# Altium schematic symbol library AA_Symbols.SchLib: 1017 symbols (part 4 of 7)
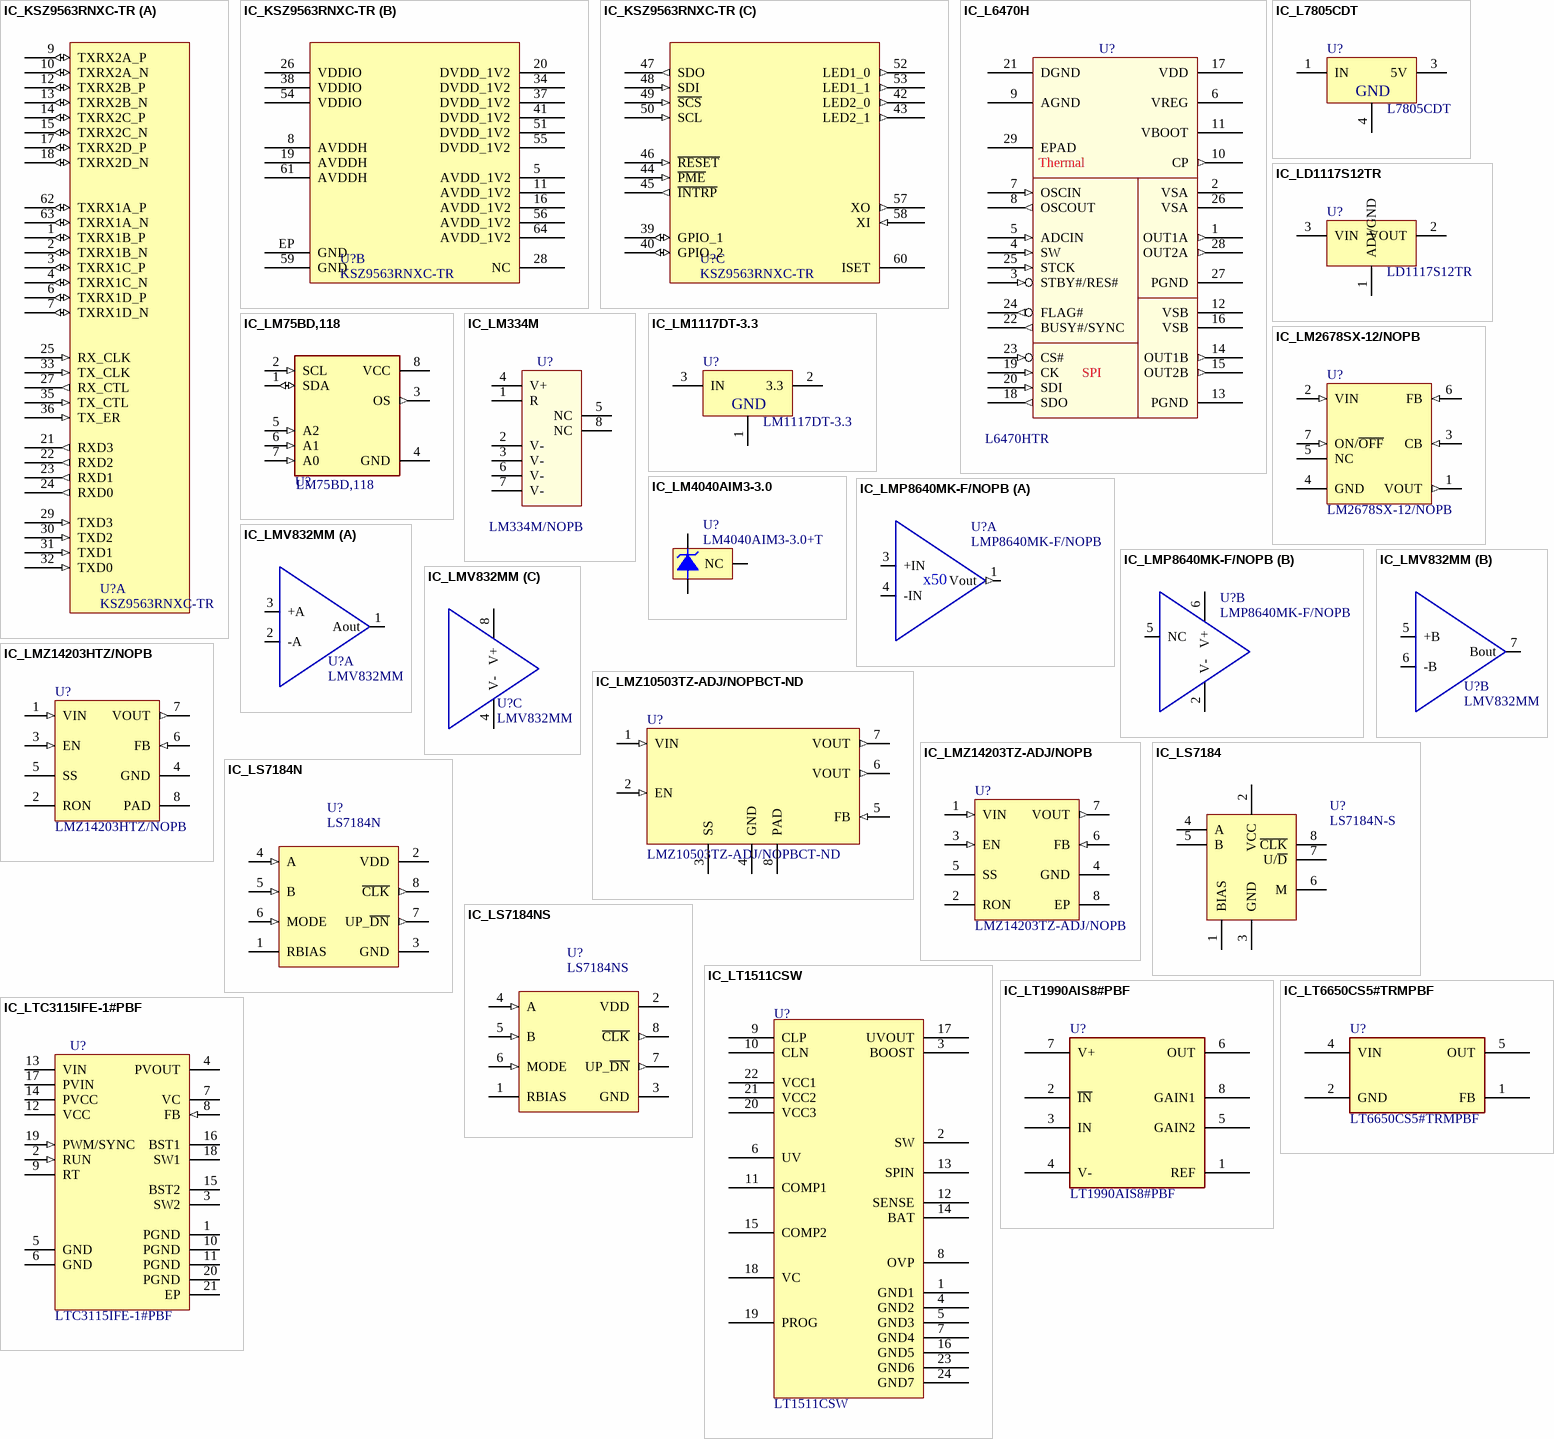
[diagram p45: symbols IC_KSZ9563RNXC-TR to IC_LTC3115IFE-1#PBF]

## IC_KSZ9563RNXC-TR
designator U?, comment KSZ9563RNXC-TR
IC, Transceiver Ethernet Switch 10/100/1000 Base-T PHY MII, RMII, RGMII Interface 64-QFN (8x8); Manufacturer: Microchip Technology; Manufacturer P/N: KSZ9563RNXC-TR
part A pins: 1 TXRX1B_P (io), 2 TXRX1B_N (io), 3 TXRX1C_P (io), 4 TXRX1C_N (io), 6 TXRX1D_P (io), 7 TXRX1D_N (io), 9 TXRX2A_P (io), 10 TXRX2A_N (io), 12 TXRX2B_P (io), 13 TXRX2B_N (io), 14 TXRX2C_P (io), 15 TXRX2C_N (io), 17 TXRX2D_P (io), 18 TXRX2D_N (io), 21 RXD3 (out), 22 RXD2 (out), 23 RXD1 (out), 24 RXD0 (out), 25 RX_CLK (in), 27 RX_CTL (out), 29 TXD3 (in), 30 TXD2 (in), 31 TXD1 (in), 32 TXD0 (in), 33 TX_CLK (in), 35 TX_CTL (in), 36 TX_ER (in), 62 TXRX1A_P (io), 63 TXRX1A_N (io)
part B pins: 5 AVDD_1V2 (power), 8 AVDDH (power), 11 AVDD_1V2 (power), 16 AVDD_1V2 (power), 19 AVDDH (power), 20 DVDD_1V2 (power), 26 VDDIO (power), 28 NC, 34 DVDD_1V2 (power), 37 DVDD_1V2 (power), 38 VDDIO (power), 41 DVDD_1V2 (power), 51 DVDD_1V2 (power), 54 VDDIO (power), 55 DVDD_1V2 (power), 56 AVDD_1V2 (power), 59 GND (power), 61 AVDDH (power), 64 AVDD_1V2 (power), EP GND (power)
part C pins: 39 GPIO_1 (io), 40 GPIO_2 (io), 42 LED2_0 (out), 43 LED2_1 (out), 44 ~{PME} (in), 45 ~{INTRP} (out), 46 ~{RESET} (in), 47 SDO (out), 48 SDI (in), 49 ~{SCS} (in), 50 SCL (in), 52 LED1_0 (out), 53 LED1_1 (out), 57 XO (out), 58 XI (in), 60 ISET (power)

## IC_L6470H
designator U?, comment L6470HTR
IC, Stepper Motor Driver; Manufacturer: STMicroelectronics; Outset P/N: PN-0002758; Manufacturer P/N: L6470HTR; Value: L6470HTR
footprint HTSSOP65P640X120_HS-29N (TSOP, 28-Leads, Body 9.70x4.40mm, Pitch 0.65mm, Thermal Pad 5.50x2.80mm, IPC Medium Density)
pins: 1 OUT1A (out), 2 VSA (power), 3 STBY#/RES# (in), 4 SW (in), 5 ADCIN (in), 6 VREG (power), 7 OSCIN (in), 8 OSCOUT (out), 9 AGND (power), 10 CP (out), 11 VBOOT (power), 12 VSB (power), 13 PGND (power), 14 OUT1B (out), 15 OUT2B (out), 16 VSB (power), 17 VDD (power), 18 SDO (out), 19 CK (in), 20 SDI (in), 21 DGND (power), 22 BUSY#/SYNC (out), 23 CS# (in), 24 FLAG# (out), 25 STCK (in), 26 VSA (power), 27 PGND (power), 28 OUT2A (out), 29 EPAD (power)
text: Thermal; SPI

## IC_L7805CDT
designator U?, comment L7805CDT
IC, Voltage Regulator, 1.5A, 5V, D2PAK; Manufacturer: STMicroelectronics; Manufacturer P/N: L7805CD2T-TR; Outset P/N: 0000118
footprint d2pak (D2-PAK, 3-Pads, Body 9.6x10.7mm (max), IPC Medium Density)
pins: 1 IN, 3 5V, 4 GND

## IC_LD1117S12TR
designator U?, comment LD1117S12TR
IC, Linear Voltage Regulator IC Positive Fixed 1.2V Output 800mA SOT-223; Manufacturer: STMicroelectronics; Outset P/N: PN-0008211; Value: LD1117S12TR; Manufacturer P/N: LD1117S12TR
footprint SOT223-4P230_700X180L87X72N (Small Outline Transistor, SOT-223 Type, 2.30 mm pitch; 4 pin, 6.50 mm L X 3.50 mm W X 1.80 mm H body)
pins: 1 ADJ/GND, 2 VOUT, 3 VIN

## IC_LM75BD,118
designator U?, comment LM75BD,118
IC, Temperature Sensor Digital, Local -55°C ~ 125°C 11 b 8-SO; Manufacturer: NXP USA Inc.; Outset P/N: PN-0008212; Temperature: -55C ~ 125C; Manufacturer P/N: LM75BD,118; Value: LM75BD,118
footprint SOIC8P127_490X600X175L70X42N (Small Outline IC (SOIC), 1.27 mm pitch; 8 pin, 4.90 mm L X 3.90 mm W X 1.75 mm H body)
pins: 1 SDA (io), 2 SCL (in), 3 OS (out), 4 GND (power), 5 A2 (in), 6 A1 (in), 7 A0 (in), 8 VCC (power)

## IC_LM334M
designator U?, comment LM334M/NOPB
IC, 3-Term Current Source, SOIC-8; Manufacturer: Texas Instruments; Outset P/N: PN-0002762; Manufacturer P/N: LM334M/NOPB; Value: LM334M/NOPB
footprint SOIC_8PIN
pins: 1 R (power), 2 V- (power), 3 V- (power), 4 V+ (power), 5 NC, 6 V- (power), 7 V- (power), 8 NC

## IC_LM1117DT-3.3
designator U?, comment LM1117DT-3.3
IC, Voltage Regulator, 800mA, 3.3V, DPAK; Manufacturer: Texas Instruments; Manufacturer P/N: LM1117DT-3.3/NOPB; Outset P/N: 0000119
footprint TO-252-3 (Voltage Regulator)
pins: 1 GND, 2 3.3, 3 IN

## IC_LM2678SX-12/NOPB
designator U?, comment LM2678SX-12/NOPB
IC, Buck Switching Regulator IC Positive Fixed 12V 1 Output 5A TO-263-8, D²Pak (7 Leads + Tab), TO-263CA; Manufacturer: Texas Instruments; Outset P/N: PN-0008213; Manufacturer P/N: LM2678SX-12/NOPB; Value: LM2678SX-12/NOPB
pins: 1 VOUT (out), 2 VIN (in), 3 CB (in), 4 GND (power), 5 NC, 6 FB (in), 7 ON/~{OFF} (in)

## IC_LM4040AIM3-3.0
designator U?, comment LM4040AIM3-3.0+T
IC, Voltage Reference, 3.0V, Precision Micropower Shunt; Manufacturer: Maxim; Outset P/N: 0000121; Manufacturer P/N: LM4040AIM3-3.0+T
footprint SOT-23 (SOT-23; 3 Leads; Body 3.0 x 2.6 mm, inc. leads (LxW max))
pins: 1 +V, 2 -V, 3 NC

## IC_LMP8640MK-F/NOPB
designator U?, comment LMP8640MK-F/NOPB
IC, High Volage Current Sensor, LMP8640MK-F/NOPB, 6SOT; Manufacturer: Texas Instruments; Outset P/N: PN-0001690; Manufacturer P/N: LMP8640MK-F/NOPB; Value: LMP8640MK-F/NOPB
footprint LMP8640MK_SOT95P280X110-6N (MO-193-AA) (SOT,0.95mm,pitch;6 pin,1.60mm W X 2.90mm L X 1.10mm H body)
part A pins: 1 Vout (out), 3 +IN, 4 -IN
part B pins: 2 V- (power), 5 NC (power), 6 V+ (power)
part A text: x50

## IC_LMV832MM
designator U?, comment LMV832MM
IC, Dual Op-amp, Low Power CMOS, EMI Hardened; Manufacturer: Texas Instruments; Manufacturer P/N: LMV832MME/NOPB; Outset P/N: 0000123
footprint MSOP_8PIN (MSOP, 8-Leads, Body 3.1x3.1mm (max), Pitch 0.65mm, IPC Medium Density)
part A pins: 1 Aout, 2 -A, 3 +A
part B pins: 5 +B, 6 -B, 7 Bout
part C pins: 4 V- (power), 8 V+ (power)

## IC_LMZ10503TZ-ADJ/NOPBCT-ND
designator U?, comment LMZ10503TZ-ADJ/NOPBCT-ND
IC, 3A SIMPLE SWITCHER Power Module with 5.5V Maximum Input Voltage; Manufacturer: Texas Instruments; Outset P/N: PN-0003751; Manufacturer P/N: LMZ10503TZ-ADJ/NOPBCT-ND; Value: LMZ10503TZ-ADJ/NOPBCT-ND
footprint TZA07A_V (D2-PAK, 8-Leads, Body 9.9x10.2mm, Pitch 1.27mm, Lead Span 13.8mm, NSC Recommended)
pins: 1 VIN (in), 2 EN (in), 3 SS, 4 GND (power), 5 FB (in), 6 VOUT (out), 7 VOUT (out), 8 PAD

## IC_LMZ14203HTZ/NOPB
designator U?, comment LMZ14203HTZ/NOPB
IC, 3A SIMPLE SWITCHER HVOut Power Module with 42V Maximum Input Voltage; Manufacturer: Texas Instruments; Outset P/N: PN-0001723; Manufacturer P/N: LMZ14203HTZ/NOPB; Value: LMZ14203HTZ/NOPB
footprint TZA07A_V (D2-PAK, 8-Leads, Body 9.9x10.2mm, Pitch 1.27mm, Lead Span 13.8mm, NSC Recommended)
pins: 1 VIN (in), 2 RON, 3 EN (in), 4 GND (power), 5 SS, 6 FB (in), 7 VOUT (out), 8 PAD

## IC_LMZ14203TZ-ADJ/NOPB
designator U?, comment LMZ14203TZ-ADJ/NOPB
IC, 3A SIMPLE SWITCHER Power Module with 42V Maximum Input Voltage; Manufacturer: National Semiconductor; Outset P/N: 0000124; Manufacturer P/N: LMZ14203TZ-ADJ/NOPB
footprint TZA07A_V (D2-PAK, 8-Leads, Body 9.9x10.2mm, Pitch 1.27mm, Lead Span 13.8mm, NSC Recommended)
pins: 1 VIN (in), 2 RON, 3 EN (in), 4 GND (power), 5 SS, 6 FB (in), 7 VOUT (out), 8 EP

## IC_LS7184
designator U?, comment LS7184N-S
IC, Quadrature Clock Converter; Manufacturer: LSI/CSI; Outset P/N: 0000125; Manufacturer P/N: LS7184N-S
footprint SOIC_8PIN
pins: 1 BIAS, 2 VCC, 3 GND, 4 A "CH A", 5 B "CH B", 6 M "Mode", 7 U/~{D} "Up/Down", 8 ~{CLK} "Clock"

## IC_LS7184N
designator U?, comment LS7184N
IC, Quadrature Clock Converter; Manufacturer: LSI/CSI; Outset P/N: PN-0001648; Value: LS7184N; Manufacturer P/N: LS7184N
footprint LS7184N_DIP762W27P254L1016H533Q8 (Footprint not found)
pins: 1 RBIAS "BIAS", 2 VDD (power) "VCC", 3 GND (power), 4 A (in) "CH A", 5 B (in) "CH B", 6 MODE (in) "Mode", 7 UP_~{DN} (out) "Up/Down", 8 ~{CLK} (out) "Clock"

## IC_LS7184NS
designator U?, comment LS7184NS
IC, Quadrature Clock Converter, LS7184NS, 8-DIP; Manufacturer: LSI/CSI; Outset P/N: PN-0001649; Value: LS7184NS; Manufacturer P/N: LS7184NS
footprint LS7184NS_SOIC127P600X175-8L
pins: 1 RBIAS "BIAS", 2 VDD (power) "VCC", 3 GND (power), 4 A (in) "CH A", 5 B (in) "CH B", 6 MODE (in) "Mode", 7 UP_~{DN} (out) "Up/Down", 8 ~{CLK} (out) "Clock"

## IC_LT1511CSW
designator U?, comment LT1511CSW  (value not drawn)
IC, LT1511 Battery Charger, 3A; Manufacturer: Linear Tech; Manufacturer P/N: LT1511CSW#PBF; Outset P/N: 0000126
footprint SOIC_SW24
pins: 1 GND1, 2 SW, 3 BOOST, 4 GND2, 5 GND3, 6 UV, 7 GND4, 8 OVP, 9 CLP, 10 CLN, 11 COMP1, 12 SENSE, 13 SPIN, 14 BAT, 15 COMP2, 16 GND5, 17 UVOUT, 18 VC, 19 PROG, 20 VCC3, 21 VCC2, 22 VCC1, 23 GND6, 24 GND7

## IC_LT1990AIS8#PBF
designator U?, comment LT1990AIS8#PBF
IC, Differential Amplifier, 1 Circuit, 8-SO; Manufacturer: Analog Devices Inc.; Outset P/N: PN-0007133; Manufacturer P/N: LT1990AIS8#PBF; VALUE: LT1990AIS8#PBF
footprint SOIC8P127_490X599X175L84X41N (D_MS-012AA)
pins: 1 REF, 2 ~{IN}, 3 IN, 4 V- (power), 5 GAIN2, 6 OUT, 7 V+ (power), 8 GAIN1

## IC_LT6650CS5#TRMPBF
designator U?, comment LT6650CS5#TRMPBF
IC, Voltage Reference, Fixed 0.4V, ±0.75% Tol, 200 µA, TSOT-23-5; Manufacturer: Analog Devices Inc.; Outset P/N: PN-0007132; Manufacturer P/N: LT6650CS5#TRMPBF; VALUE: LT6650CS5#TRMPBF
footprint SOT95P280X100-5N (MO-193)
pins: 1 FB, 2 GND (power), 4 VIN (power), 5 OUT

## IC_LTC3115IFE-1#PBF
designator U?, comment LTC3115IFE-1#PBF
IC, 40 V 2A Synchronous Buck-Boost DC/DC Converter, LTC3115IFE-1#PBF, 20TSSOP; Manufacturer: Linear Technology; Outset P/N: PN-0001704; Manufacturer P/N: LTC3115IFE-1#PBF; Value: LTC3115IFE-1#PBF
footprint LTC3115IFE_SOP65P640X120-21AN (SOP,0.65mm,pitch;20 pin,4.40mm W X 6.50mm L X 1.20mm H body (w/thermal tab))
pins: 1 PGND (power) "Power Ground Connections. These pins should be connected to the power ground in the application. The exposed pad is the power ground connection. It must be soldered to the PCB and electrically connected to ground through the (See Datasheet)", 2 RUN (in) "Input to Enable and Disable the IC and Set Custom Input UVLO Thresholds. The RUN pin can be driven by an external logic signal to enable and disable the IC. In addition, the voltage on this pin can be set by a resistor (See Datasheet)", 3 SW2 "Buck-Boost Converter Power Switch Pin. This pin should be connected to one side of the buckboost inductor.", 4 PVOUT (power) "Buck-Boost Converter Power Output. This pin should be connected to a low ESR capacitor with a value of at least 10uF. The capacitor should be placed as close to the IC as possible and should have a short return path to (See Datasheet)", 5 GND (power) "Signal Ground. These pins are the ground connections for the control circuitry of the IC and must be tied to ground in the application.", 6 GND (power) "Signal Ground. These pins are the ground connections for the control circuitry of the IC and must be tied to ground in the application.", 7 VC "Error Amplifier Output. A frequency compensation network must be connected between this pin and FB to stabilize the voltage control loop.", 8 FB (in) "Feedback Voltage Input. A resistor divider connected to this pin sets the output voltage for the buckboost converter. The nominal FB voltage is 1000mV. Care should be taken in the routing of connections to this pin in order (See Datasheet)", 9 RT "Oscillator Frequency Programming Pin. A resistor placed between this pin and ground sets the switching frequency of the buck-boost converter.", 10 PGND (power) "Power Ground Connections. These pins should be connected to the power ground in the application. The exposed pad is the power ground connection. It must be soldered to the PCB and electrically connected to ground through the (See Datasheet)", 11 PGND (power) "Power Ground Connections. These pins should be connected to the power ground in the application. The exposed pad is the power ground connection. It must be soldered to the PCB and electrically connected to ground through the (See Datasheet)", 12 VCC (power) "Low Voltage Supply Input for IC Control Circuitry. This pin powers internal IC control circuitry and must be connected to the PVCC pin in the application. A 4.7uF or larger bypass capacitor should be connected between this (See Datasheet)", 13 VIN (power) "Power Supply Connection for Internal Circuitry and the VCC Regulator. This pin provides power to the internal VCC regulator and is the input voltage sense connection for the VIN divider. A 0.1uF bypass capacitor should be (See Datasheet)", 14 PVCC (power) "Internal VCC Regulator Output. This pin is the output pin of the internal linear regulator that generates the VCC rail from VIN. The PVCC pin is also the supply connection for the power switch gate drivers. If the trace (See Datasheet)", 15 BST2 "Flying Capacitor Pin for SW2. This pin must be connected to SW2 through a 0.1uF capacitor. This pin is used to generate the gate drive rail for power switch D.", 16 BST1 "Flying Capacitor Pin for SW1. This pin must be connected to SW1 through a 0.1uF capacitor. This pin is used to generate the gate drive rail for power switch A.", 17 PVIN (power) "Power Input for the Buck-Boost Converter. A 4.7uF or larger bypass capacitor should be connected between this pin and ground. The bypass capacitor should be located as close to the IC as possible and should via directly down (See Datasheet)", 18 SW1 "Buck-Boost Converter Power Switch Pin. This pin should be connected to one side of the buckboost inductor", 19 PWM/SYNC (in) "Burst Mode/PWM Mode Control Pin and Synchronization Input. Forcing this pin high causes the IC to operate in fixed frequency PWM mode at all loads using the internal oscillator at the frequency set by the RT Pin. Forcing (See Datasheet)", 20 PGND (power) "Power Ground Connections. These pins should be connected to the power ground in the application. The exposed pad is the power ground connection. It must be soldered to the PCB and electrically connected to ground through the (See Datasheet)", 21 EP (power) "Power Ground Connections. These pins should be connected to the power ground in the application. The exposed pad is the power ground connection. It must be soldered to the PCB and electrically connected to ground through the (See Datasheet)"

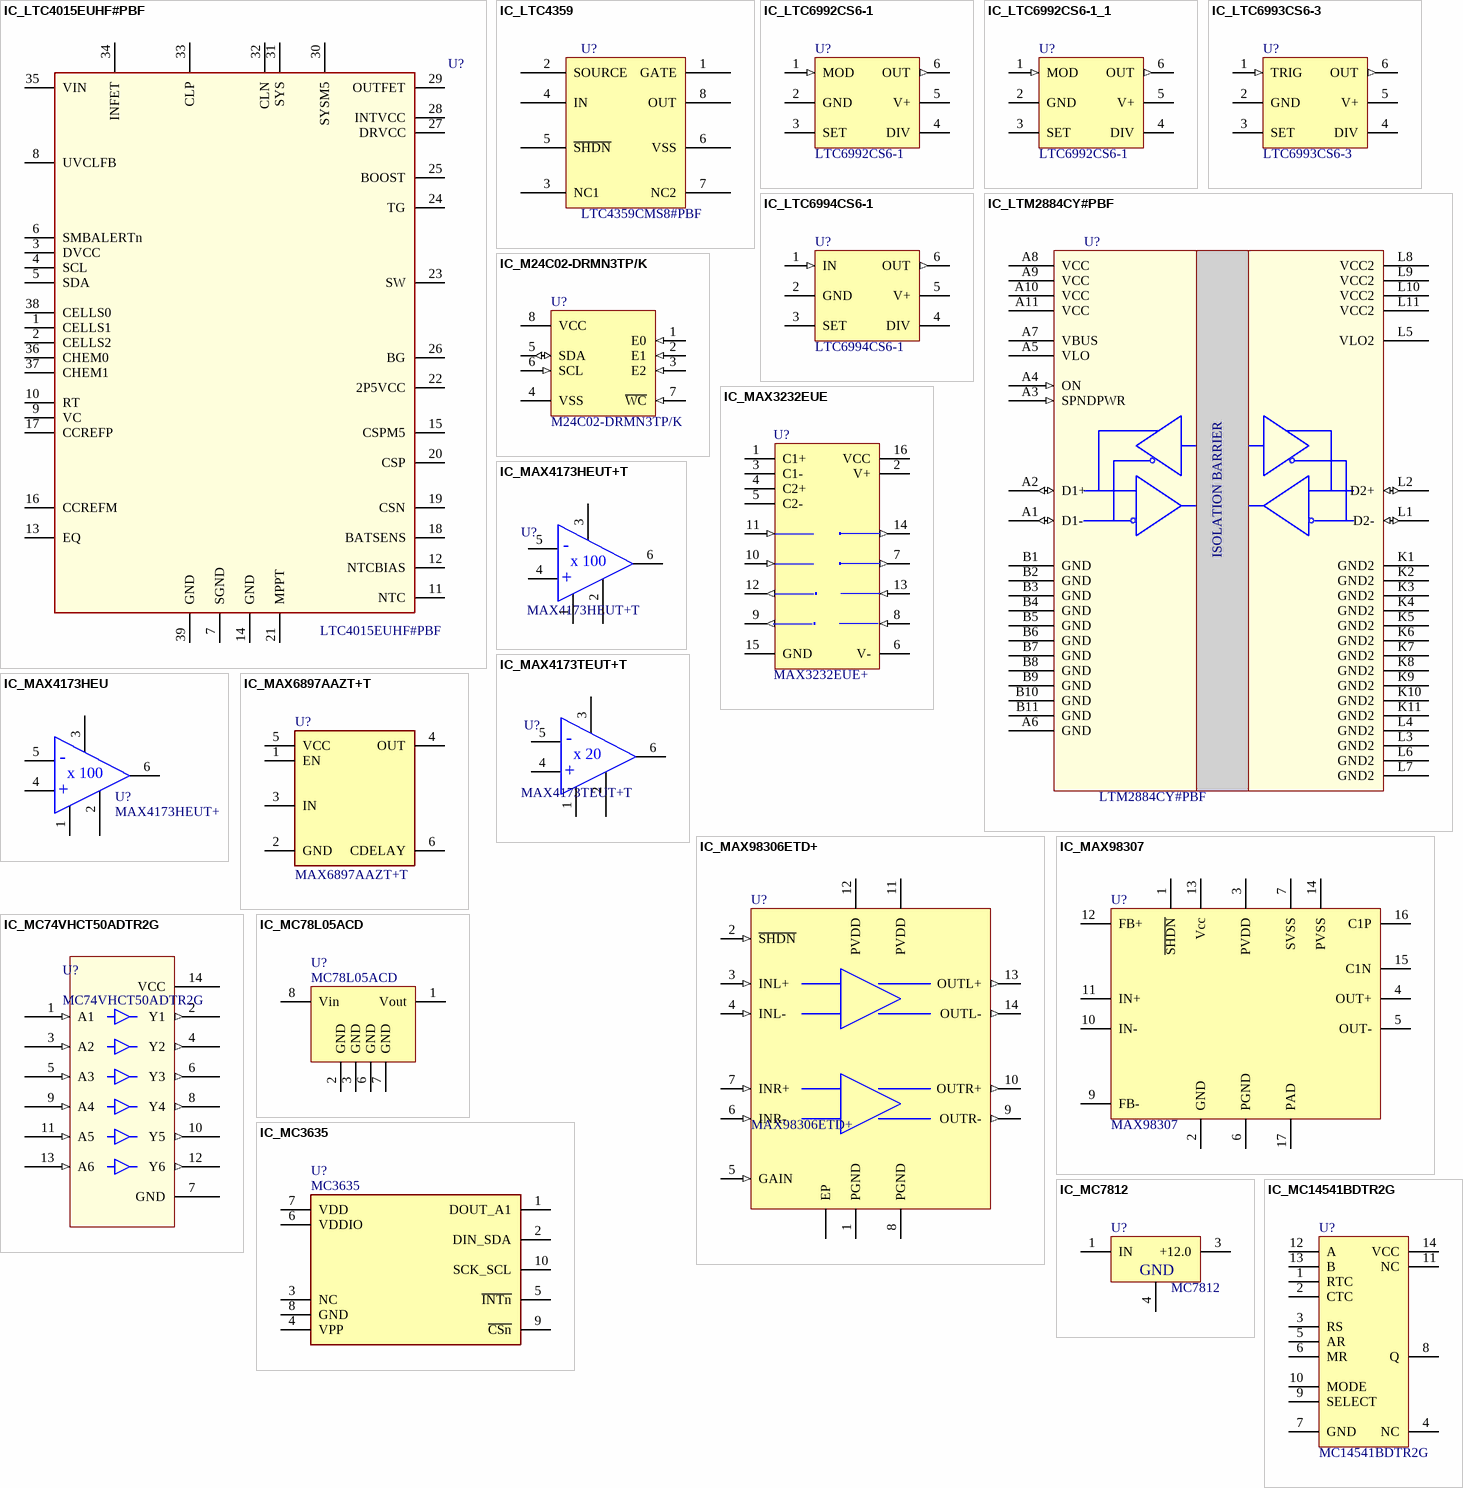
[diagram p21: symbols IC_LTC4015EUHF#PBF to IC_MC14541BDTR2G]

## IC_LTC4015EUHF#PBF
designator U?, comment LTC4015EUHF#PBF
IC, Battery Charger, Multi-Chemistry, 35V Supply, I2C Interface, Surface Mount, 38-WFQFN Exposed Pad; Manufacturer: Analog Devices; Outset P/N: PN-0007280; Temperature: -40C ~ 125C; Manufacturer P/N: LTC4015EUHF#PBF; VALUE: LTC4015EUHF#PBF
footprint QFN-38_UHF_LIT
footprint QFN39P50_700X500X80L40X25T550X300N (Quad Flat No-Lead (QFN) with Thermal Tab, 0.50 mm pitch;  rect., 12 pin X 7 pin, 7.00 mm L X 5.00 mm W X 0.80 mm H Body)
pins: 1 CELLS1, 2 CELLS2, 3 DVCC, 4 SCL, 5 SDA, 6 SMBALERTn, 7 SGND, 8 UVCLFB, 9 VC, 10 RT, 11 NTC, 12 NTCBIAS, 13 EQ, 14 GND, 15 CSPM5, 16 CCREFM, 17 CCREFP, 18 BATSENS, 19 CSN, 20 CSP, 21 MPPT, 22 2P5VCC, 23 SW, 24 TG, 25 BOOST, 26 BG, 27 DRVCC, 28 INTVCC, 29 OUTFET, 30 SYSM5, 31 SYS, 32 CLN, 33 CLP, 34 INFET, 35 VIN, 36 CHEM0, 37 CHEM1, 38 CELLS0, 39 GND

## IC_LTC4359
designator U?, comment LTC4359CMS8#PBF
IC, Power Switch, Ideal Diode; Manufacturer: Linear Tech; Outset P/N: 0000128; Manufacturer P/N: LTC4359CMS8#PBF
footprint MSOP_8PIN (MSOP, 8-Leads, Body 3.1x3.1mm (max), Pitch 0.65mm, IPC Medium Density)
pins: 1 GATE, 2 SOURCE, 3 NC1, 4 IN, 5 ~{SHDN}, 6 VSS, 7 NC2, 8 OUT

## IC_LTC6992CS6-1
designator U?, comment LTC6992CS6-1
IC, Pulse Width Modulator, Voltage Controlled; Manufacturer: Linear Tech; Manufacturer P/N: LTC6992CS6-1#TRMPBF; Outset P/N: 0000129
footprint TSOT-23_6PIN (TSOT-23, 6-Leads, Body 3.1x2.9mm (max), Pitch 0.95mm, IPC Medium Density)
pins: 1 MOD (in), 2 GND (power), 3 SET, 4 DIV, 5 V+ (power), 6 OUT (out)

## IC_LTC6992CS6-1_1
designator U?, comment LTC6992CS6-1
IC, Pulse Width Modulator, Voltage Controlled; Manufacturer: Linear Tech; Manufacturer P/N: LTC6992CS6-1#TRMPBF; Outset P/N: 0000129
footprint TSOT-23_6PIN (TSOT-23, 6-Leads, Body 3.1x2.9mm (max), Pitch 0.95mm, IPC Medium Density)
pins: 1 MOD (in), 2 GND (power), 3 SET, 4 DIV, 5 V+ (power), 6 OUT (out)

## IC_LTC6993CS6-3
designator U?, comment LTC6993CS6-3
IC, Monostable Pulse Generator, One-Shot; Manufacturer: Linear Tech; Outset P/N: 0000130; Manufacturer P/N: LTC6993CS6-3
footprint TSOT-23_6PIN (TSOT-23, 6-Leads, Body 3.1x2.9mm (max), Pitch 0.95mm, IPC Medium Density)
pins: 1 TRIG (in), 2 GND (power), 3 SET, 4 DIV, 5 V+ (power), 6 OUT (out)

## IC_LTC6994CS6-1
designator U?, comment LTC6994CS6-1
IC, Delay block, SOT-23; Manufacturer: Linear Tech; Outset P/N: 0000131; Manufacturer P/N: LTC6994CS6-1
footprint TSOT-23_6PIN (TSOT-23, 6-Leads, Body 3.1x2.9mm (max), Pitch 0.95mm, IPC Medium Density)
pins: 1 IN (in), 2 GND (power), 3 SET, 4 DIV, 5 V+ (power), 6 OUT (out)

## IC_LTM2884CY#PBF
designator U?, comment LTM2884CY#PBF
IC, Isolated USB 2.0 Transceiver, LTM2884CY#PBF, 44BGA; Manufacturer: Linear Technology; Outset P/N: PN-0001698; Manufacturer P/N: LTM2884CY#PBF; Value: LTM2884CY#PBF
footprint LTM2884CY#PBF_BGA44C127P11X4 (BGA,1.27mm pitch,square;144 pin,11columns X 4 rows,15.00mm X 15.00mm X 5.22mm H)
pins: A1 D1- (io), A2 D1+ (io), A3 SPNDPWR (in), A4 ON (in), A5 VLO (power), A6 GND (power), A7 VBUS (power), A8 VCC (power), A9 VCC (power), A10 VCC (power), A11 VCC (power), B1 GND (power), B2 GND (power), B3 GND (power), B4 GND (power), B5 GND (power), B6 GND (power), B7 GND (power), B8 GND (power), B9 GND (power), B10 GND (power), B11 GND (power), K1 GND2 (power), K2 GND2 (power), K3 GND2 (power), K4 GND2 (power), K5 GND2 (power), K6 GND2 (power), K7 GND2 (power), K8 GND2 (power), K9 GND2 (power), K10 GND2 (power), K11 GND2 (power), L1 D2- (io), L2 D2+ (io), L3 GND2 (power), L4 GND2 (power), L5 VLO2 (power), L6 GND2 (power), L7 GND2 (power), L8 VCC2 (power), L9 VCC2 (power), L10 VCC2 (power), L11 VCC2 (power)
text: ISOLATION BARRIER

## IC_M24C02-DRMN3TP/K
designator U?, comment M24C02-DRMN3TP/K
IC, EEPROM 2KBIT 400KHZ M24C02-DRMN3TP/K, 8SOIC; Manufacturer: STMicroelectronics; Outset P/N: PN-0002780; Manufacturer P/N: M24C02-DRMN3TP/K; Value: M24C02-DRMN3TP/K
footprint M24C02-DRMN3TP/K_SOIC127P600X175-8N (Footprint not found)
pins: 1 E0 (in), 2 E1 (in), 3 E2 (in), 4 VSS (power), 5 SDA (io), 6 SCL (in), 7 ~{WC} (in), 8 VCC (power)

## IC_MAX3232EUE
designator U?, comment MAX3232EUE+
IC, RS-232 Transceiver; Manufacturer: Maxim; Outset P/N: 0000132; Manufacturer P/N: MAX3232EUE+
footprint TSSOP_16PIN (TSSOP, 16-Leads, Body 5.1x4.5mm (max), Pitch 0.65mm, IPC Medium Density)
pins: 1 C1+, 2 V+ (power), 3 C1-, 4 C2+, 5 C2-, 6 V- (power), 7 T2OUT (out), 8 R2IN (in), 9 R2OUT (out), 10 T2IN (in), 11 T1IN (in), 12 R1OUT (out), 13 R1IN (in), 14 T1OUT (out), 15 GND (power), 16 VCC (power)

## IC_MAX4173HEU
designator U?, comment MAX4173HEUT+
IC, AMP CURR-SENSE HI-SIDE, MAX4173H, 8-SOIC; Manufacturer: Maxim; Manufacturer P/N: MAX4173HEUT+T; Outset P/N: 0000133
footprint TSOT-23_6PIN (TSOT-23, 6-Leads, Body 3.1x2.9mm (max), Pitch 0.95mm, IPC Medium Density)
pins: 1 GND, 2 GND, 3 VCC, 4 +, 5 -, 6 OUT
text: x 100

## IC_MAX4173HEUT+T
designator U?, comment MAX4173HEUT+T
IC, Current Sense Amplifier, MAX4173HEUT+, SOT23-6; Manufacturer: Maxim Integrated; Outset P/N: PN-0001682; Value: MAX4173HEUT+T; Manufacturer P/N: MAX4173HEUT+T
footprint MAX4173TEUT+T_SOT95P280X145-6L25N (Small Outline Transistor (SOT23), 0.95 mm pitch; 6 pin, 2.90 mm L X 1.625 mm W X 1.45 mm H body)
pins: 1 GND, 2 GND, 3 VCC, 4 +, 5 -, 6 OUT
text: x 100

## IC_MAX4173TEUT+T
designator U?, comment MAX4173TEUT+T
IC, Current Sense Amplifier, MAX4173TEUT+T, SOT23-6; Manufacturer: Maxim Integrated; Outset P/N: PN-0001650; Value: MAX4173TEUT+T; Manufacturer P/N: MAX4173TEUT+T
footprint MAX4173TEUT+T_SOT95P280X145-6L25N (Small Outline Transistor (SOT23), 0.95 mm pitch; 6 pin, 2.90 mm L X 1.625 mm W X 1.45 mm H body)
pins: 1 GND, 2 GND, 3 VCC, 4 +, 5 -, 6 OUT
text: x 20

## IC_MAX6897AAZT+T
designator U?, comment MAX6897AAZT+T
IC, Supervisor, 1 CH, TSOT23-6; Manufacturer: Analog Devices Inc./Maxim Integrated; Outset P/N: PN-0007140; Manufacturer P/N: MAX6897AAZT+T; Value: MAX6897AAZT+T
footprint SOT23-6P95_275X110L40X37N
pins: 1 EN, 2 GND, 3 IN, 4 OUT, 5 VCC (power), 6 CDELAY

## IC_MAX98306ETD+
designator U?, comment MAX98306ETD+
IC, Audio Power Amplifier, 2-channel, Class D, 3.7W; Manufacturer: Maxim; Outset P/N: PN-0008407; Manufacturer P/N: MAX98306ETD+
footprint SON15P40_295X295X80L30X20T230X170N (T1433+2) (Small Outline No-Lead (SON) with Thermal Tab, 0.40 mm pitch; 14 pin, 2.95 mm L X 2.95 mm W X 0.80 mm H body)
pins: 1 PGND (power), 2 ~{SHDN} (in), 3 INL+ (in), 4 INL- (in), 5 GAIN (in), 6 INR- (in), 7 INR+ (in), 8 PGND (power), 9 OUTR- (out), 10 OUTR+ (out), 11 PVDD (power), 12 PVDD (power), 13 OUTL+ (out), 14 OUTL- (out), 15 EP (power)

## IC_MAX98307
designator U?, comment MAX98307
IC, Audio Power Amplifier, Multilevel, Class DG, 3.3W; Manufacturer: Maxim; Manufacturer P/N: MAX98307ETE+T; Outset P/N: 0000134
footprint TQFN-16-EP (QFN, 16-Leads, Body 3.1x3.1mm (max), Pitch 0.50mm, IPC Medium Density)
pins: 1 ~{SHDN}, 2 GND (power), 3 PVDD (power), 4 OUT+, 5 OUT-, 6 PGND (power), 7 SVSS (power), 8 NC hidden, 9 FB-, 10 IN-, 11 IN+, 12 FB+, 13 Vcc (power), 14 PVSS (power), 15 C1N, 16 C1P, 17 PAD

## IC_MC74VHCT50ADTR2G
designator U?, comment MC74VHCT50ADTR2G
IC, Noninverting Buffer/Level Shifter, MC74VHCT50ADTR2G, 14TSSOP; Manufacturer: ON Semiconductor; Outset P/N: PN-0001651; Value: MC74VHCT50ADTR2G; Manufacturer P/N: MC74VHCT50ADTR2G
footprint MC74VHCT50ADTR2G_TSSOP65P640X120-14L25N (Small Outline Pkg (SOP), 0.65 mm pitch; 14 pin, 5.00 mm L X 4.40 mm W X 1.20 mm H body)
pins: 1 A1 (in), 2 Y1 (out), 3 A2 (in), 4 Y2 (out), 5 A3 (in), 6 Y3 (out), 7 GND (power), 8 Y4 (out), 9 A4 (in), 10 Y5 (out), 11 A5 (in), 12 Y6 (out), 13 A6 (in), 14 VCC (power)

## IC_MC78L05ACD
designator U?, comment MC78L05ACD
IC, Linear Voltage Regulator, 5V, 100mA; Manufacturer: ON Semiconductor; Manufacturer P/N: MC78L05ACDR2G; Outset P/N: 0000138
footprint SOIC_8PIN
pins: 1 Vout, 2 GND (power), 3 GND, 4 NC hidden, 5 NC hidden, 6 GND, 7 GND, 8 Vin

## IC_MC3635
designator U?, comment MC3635
IC, Accelerometer X, Y, Z Axis ±2g, 4g, 8g, 12g, 16g 10-LGA (1.6x1.6); Manufacturer: Memsic Inc.; Outset P/N: PN-0007202; Vaule: MC3635; Manufacturer P/N: MC3635
footprint PQFN10P40_140X140X100L30X20N (Footprint not found)
pins: 1 DOUT_A1, 2 DIN_SDA, 3 NC, 4 VPP, 5 ~{INTn}, 6 VDDIO, 7 VDD, 8 GND, 9 ~{CSn}, 10 SCK_SCL

## IC_MC7812
designator U?, comment MC7812
IC, Voltage Regulator, 1A, 12V, D2PAK; Manufacturer: ON Semiconductor; Manufacturer P/N: MC7812CD2TR4G; Outset P/N: 0000137
footprint D2PAK (D2-PAK, 3-Pads, Body 9.6x10.7mm (max), IPC Medium Density)
pins: 1 IN, 3 +12.0, 4 GND

## IC_MC14541BDTR2G
designator U?, comment MC14541BDTR2G
IC, Programable Timer, 18V. RC timing; Manufacturer: ON Semiconductor; Outset P/N: 0000135; Manufacturer P/N: MC14541BDTR2G
footprint TSSOP_14PIN (TSSOP, 14-Leads, Body 5.1x4.5mm (max), Pitch 0.65mm, IPC Medium Density)
pins: 1 RTC, 2 CTC, 3 RS, 4 NC, 5 AR, 6 MR, 7 GND (power), 8 Q (hiz), 9 SELECT, 10 MODE, 11 NC, 12 A, 13 B, 14 VCC (power)

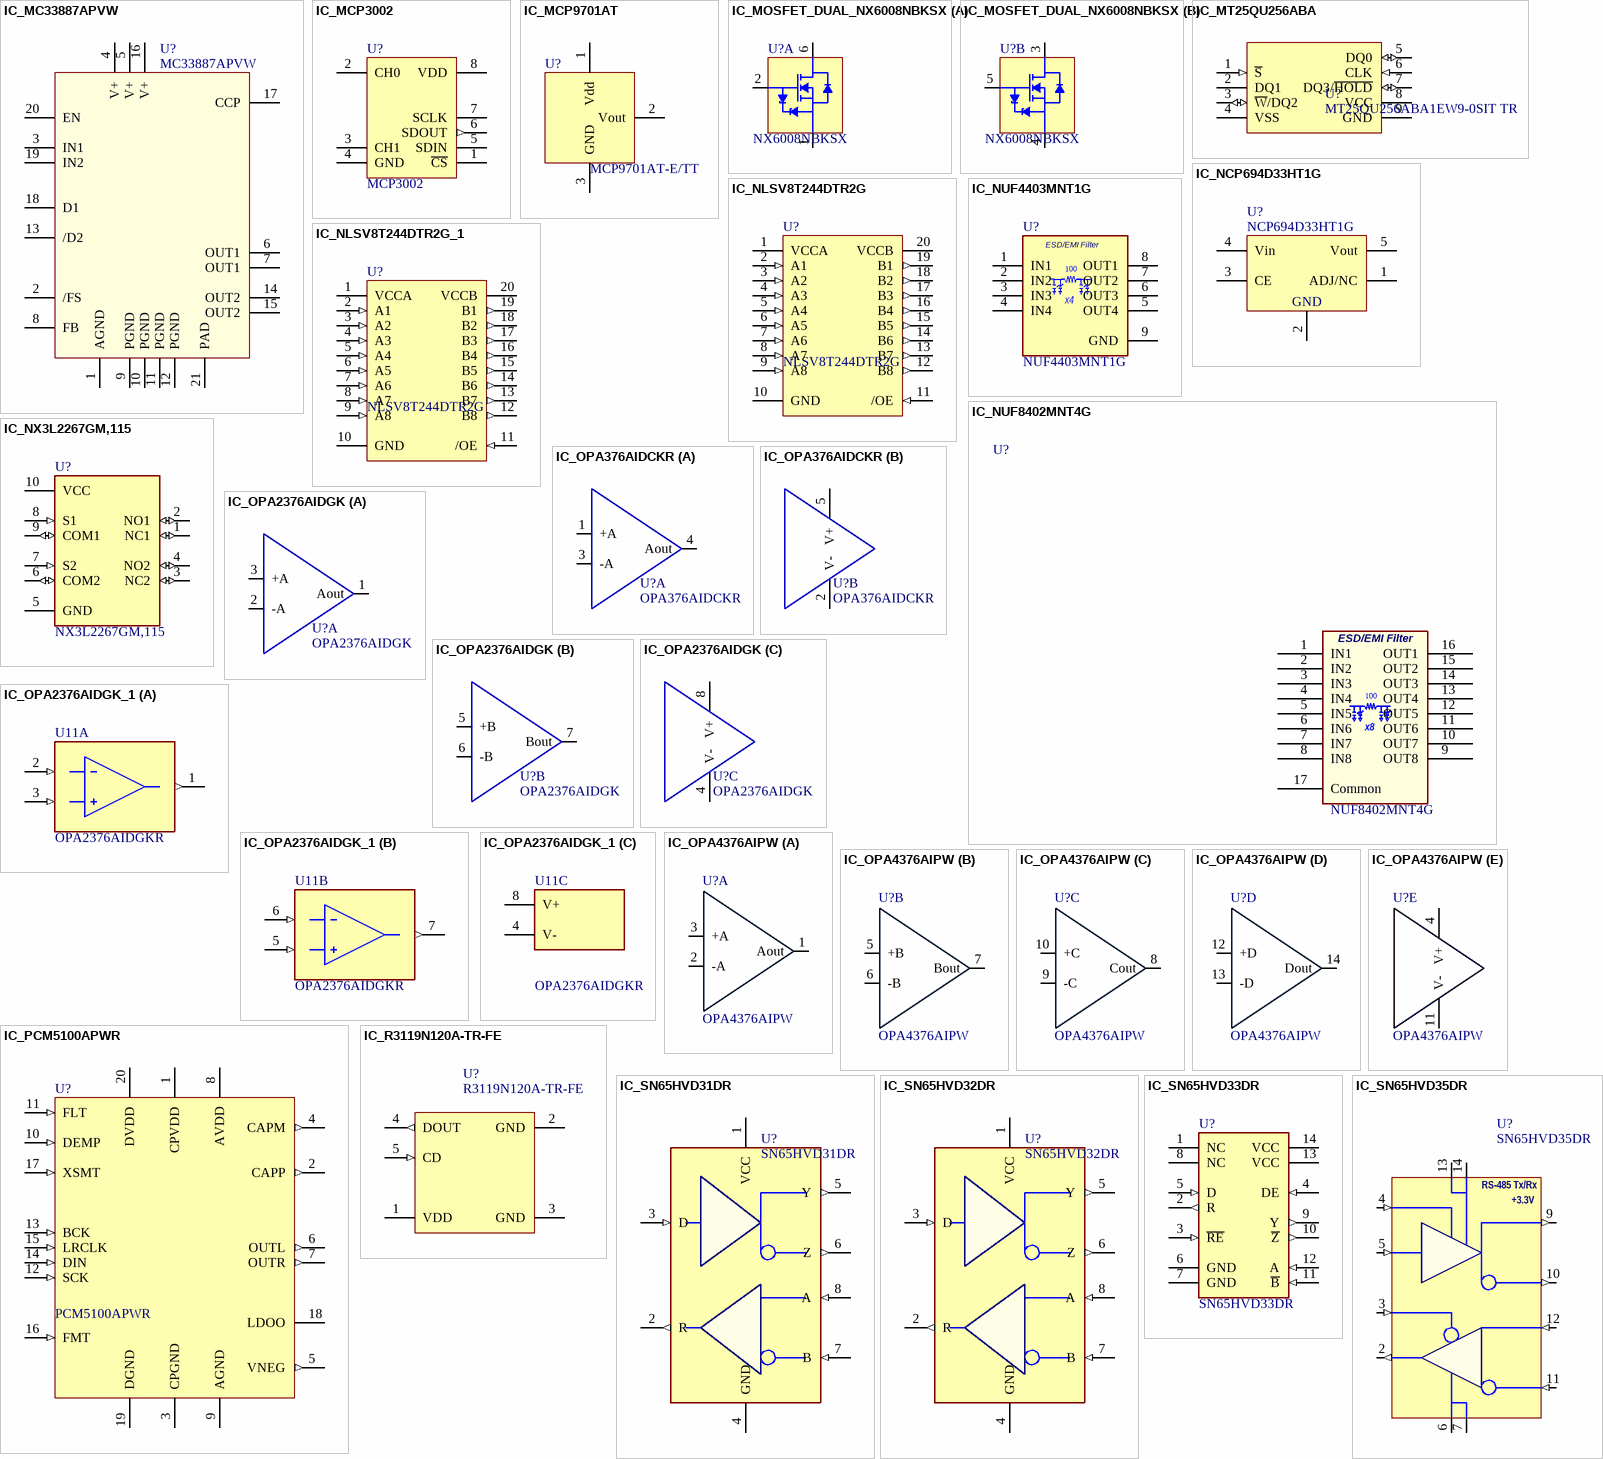
[diagram p22: symbols IC_MC33887APVW to IC_SN65HVD35DR]

## IC_MC33887APVW
designator U?, comment MC33887APVW
IC, H-Bridge, 5A, w/ Load Current Feedback; Manufacturer: Freescale; Outset P/N: 0000136; Manufacturer P/N: MC33887APVW
footprint PowerSO20_N (SOP, 20-Leads, Body 15.9x11mm, Pitch 1.27mm, IPC Medium Density)
pins: 1 AGND, 2 /FS, 3 IN1, 4 V+, 5 V+, 6 OUT1, 7 OUT1, 8 FB, 9 PGND, 10 PGND, 11 PGND, 12 PGND, 13 /D2, 14 OUT2, 15 OUT2, 16 V+, 17 CCP, 18 D1, 19 IN2, 20 EN, 21 PAD

## IC_MCP3002
designator U?, comment MCP3002
IC, 10-Bit ADC, SPI Interface; Manufacturer: Microchip Technology; Manufacturer P/N: MCP3002-I/SN; Outset P/N: 0000139
footprint SOIC_8PIN
pins: 1 ~{CS}, 2 CH0, 3 CH1, 4 GND, 5 SDIN, 6 SDOUT (out), 7 SCLK, 8 VDD

## IC_MCP9701AT
designator U?, comment MCP9701AT-E/TT
IC, Temp Sensor, Linear, Low-Power; Manufacturer: Microchip Technology; Outset P/N: 0000140; Manufacturer P/N: MCP9701AT-E/TT
footprint SOT-23 (SOT-23; 3 Leads; Body 3.0 x 2.6 mm, inc. leads (LxW max))
pins: 1 Vdd, 2 Vout, 3 GND

## IC_MOSFET_DUAL_NX6008NBKSX
designator U?, comment NX6008NBKSX
IC, Mosfet Array 2 N-Channel (Dual) 60V 6-TSSOP; Value: NX6008NBKSX
part A pins: 1 S1, 2 G1, 6 D1
part B pins: 3 D2, 4 S2, 5 G2

## IC_MT25QU256ABA
designator U?, comment MT25QU256ABA1EW9-0SIT TR
IC, FLASH - NOR Memory IC 256Mbit SPI 133 MHz 8-WPDFN (6x8) (MLP8); Manufacturer: Micron Technology Inc,; Outset P/N: PN-0008214; Value: MT25QU256ABA1EW9-0SIT TR; Manufacturer P/N: MT25QU256ABA1EW9-0SIT TR
footprint SON9P127_600X800X75L50X40T430X340N (Small Outline No-Lead (SON) with Thermal Tab, 1.27 mm pitch; 8 pin, 6.00 mm L X 8.00 mm W X 0.80 mm H body)
pins: 1 ~{S} (in) "BIAS", 2 DQ1 (power) "VCC", 3 ~{W}/DQ2 (io) "GND", 4 VSS (power) "CH A", 5 DQ0 (io) "CH B", 6 CLK (in) "Mode", 7 DQ3/~{HOLD} (io) "Up/Down", 8 VCC (power) "Up/Down", 9 GND (power) "Up/Down"

## IC_NCP694D33HT1G
designator U?, comment NCP694D33HT1G
IC, Linear Voltage Regulator, 3.3V, 1A; Manufacturer: ON Semiconductor; Outset P/N: 0000141; Manufacturer P/N: NCP694D33HT1G
footprint SOT89-150P420X160-5N (SOT89, 5-Leads, Body 4.5x2.4 mm, Pitch 1.5mm, Lead Span 4.2mm, IPC Medium Density)
pins: 1 ADJ/NC, 2 GND (power), 3 CE, 4 Vin, 5 Vout

## IC_NLSV8T244DTR2G
designator U?, comment NLSV8T244DTR2G
IC, Voltage Level Translator Unidirectional 1 Circuit 8 Channel 20-TSSOP; Manufacturer: onsemi; Outset P/N: PN-0008385; Manufacturer P/N: NLSV8T244DTR2G; Value: NLSV8T244DTR2G
footprint SOP20P65_650X640X120L62X24N (Small Outline Pkg (SOP), 0.65 mm pitch; 20 pin, 6.50 mm L X 4.40 mm W X 1.20 mm H body)
pins: 1 VCCA (power), 2 A1 (in), 3 A2 (in), 4 A3 (in), 5 A4 (in), 6 A5 (in), 7 A6 (in), 8 A7 (in), 9 A8 (in), 10 GND (power), 11 /OE (in), 12 B8 (out), 13 B7 (out), 14 B6 (out), 15 B5 (out), 16 B4 (out), 17 B3 (out), 18 B2 (out), 19 B1 (out), 20 VCCB (power)

## IC_NLSV8T244DTR2G_1
designator U?, comment NLSV8T244DTR2G
IC, Voltage Level Translator Unidirectional 1 Circuit 8 Channel 20-TSSOP; Manufacturer: onsemi; Manufacturer P/N: NLSV8T244DTR2G; Value: NLSV8T244DTR2G
footprint QFN21P50_450X250X80L38X24T290X100 (Quad Flat No-Lead (QFN) with Thermal Tab, 0.50 mm pitch;  rect., 8 pin X 2 pin, 4.50 mm L X 2.50 mm W X 0.80 mm H body)
pins: 1 VCCA (power), 2 A1 (in), 3 A2 (in), 4 A3 (in), 5 A4 (in), 6 A5 (in), 7 A6 (in), 8 A7 (in), 9 A8 (in), 10 GND (power), 11 /OE (in), 12 B8 (out), 13 B7 (out), 14 B6 (out), 15 B5 (out), 16 B4 (out), 17 B3 (out), 18 B2 (out), 19 B1 (out), 20 VCCB (power)

## IC_NUF4403MNT1G
designator U?, comment NUF4403MNT1G
IC, Filter, RC (PI), 100ohm, 17pF, 4 CH, SMD; Manufacturer: Onsemi; Outset P/N: PN-0007148; Manufacturer P/N: NUF4403MNT1G; VALUE: NUF4403MNT1G
footprint SON9P40_160X160X100L30X20T90X50N
pins: 1 IN1, 2 IN2, 3 IN3, 4 IN4, 5 OUT4, 6 OUT3, 7 OUT2, 8 OUT1, 9 GND
text: ESD/EMI Filter; 100; x4

## IC_NUF8402MNT4G
designator U?, comment NUF8402MNT4G
IC, 8-channel filter EMI ESD Protection, NUF8402MNT4G, 16-DFN; Manufacturer: ON Semiconductor; Outset P/N: PN-0001652; Manufacturer P/N: NUF8402MNT4G; Value: NUF8402MNT4G
footprint NUF8402MNT4G_DFN50P400X160X100-17T50X330N (DFN, 16-Leads, Thermal Tab, Body 1.60x4.00mm, Pitch 0.50mm, Thermal Pad 0.40x3.20mm, IPC Medium Density)
pins: 1 IN1, 2 IN2, 3 IN3, 4 IN4, 5 IN5, 6 IN6, 7 IN7, 8 IN8, 9 OUT8, 10 OUT7, 11 OUT6, 12 OUT5, 13 OUT4, 14 OUT3, 15 OUT2, 16 OUT1, 17 Common
text: ESD/EMI Filter; 100; x8

## IC_NX3L2267GM,115
designator U?, comment NX3L2267GM,115
IC ANALOG SWITCH SPDT 10XQFN; Manufacturer: NXP; Outset P/N: PN-0008333; TEMPERATURE: -40°C ~ 125°C; Manufacturer P/N: NX3L2267GM,115; VALUE: NX3L2267GM,115
footprint QFN10P50_155X200X50L43X20N
pins: 1 NC1 (io), 2 NO1 (io), 3 NC2 (io), 4 NO2 (io), 5 GND (power), 6 COM2 (io), 7 S2 (in), 8 S1 (in), 9 COM1 (io), 10 VCC (power)

## IC_OPA376AIDCKR
designator U?, comment OPA376AIDCKR
IC, Op-amp, Precision, Low Noise, Low Quiescent Current; Manufacturer: Texas Instruments; Outset P/N: PN-0001707; Manufacturer P/N: OPA376AIDCKR; Value: OPA376AIDCKR
footprint OPA376AIDCKR_SOP65P210X110-3L20N (Small Outline Pkg (SOP), 0.65 mm pitch; 5 pin, 2.00 mm L X 1.25 mm W X 1.10 mm H body)
part A pins: 1 +A, 3 -A, 4 Aout
part B pins: 2 V- (power), 5 V+ (power)

## IC_OPA2376AIDGK
designator U?, comment OPA2376AIDGK
IC, Dual Op-amp, Precision, Low Noise, Low Quiescent Current; Manufacturer: Texas Instruments; Outset P/N: 0000142; Manufacturer P/N: OPA2376AIDGK
footprint MSOP_8PIN (MSOP, 8-Leads, Body 3.1x3.1mm (max), Pitch 0.65mm, IPC Medium Density)
part A pins: 1 Aout, 2 -A, 3 +A
part B pins: 5 +B, 6 -B, 7 Bout
part C pins: 4 V- (power), 8 V+ (power)

## IC_OPA2376AIDGK_1
designator U11, comment OPA2376AIDGKR
IC, OPAMP GP 2 CIRCUIT 8VSSOP; MFG: Texas Instruments; Outset P/N: 0000142; TEMPERATURE: -40°C ~ 125°C; MFG_PART_NO: OPA2376AIDGKR; VALUE: OPA2376AIDGKR
footprint SOP65P490X110-8N (MO-187-AA)
part A pins: 1 OUTA (out), 2 -A (in), 3 +A (in)
part B pins: 5 +B (in), 6 -B (in), 7 OUTB (out)
part C pins: 4 V- (power), 8 V+ (power)
